# Altium footprint library PcbLib1.PcbLib: 30 footprints (part 2 of 2)
Each footprint in its own frame and in the unit in brackets; x right, y up, seen from the top. Pads: shape width x height; smd on the part's side, far side on the other; paste and mask are expansions set on the pad; w line width, h text height; cw(c..) or ccw(c..) is an arc to the next point about the centre after c.
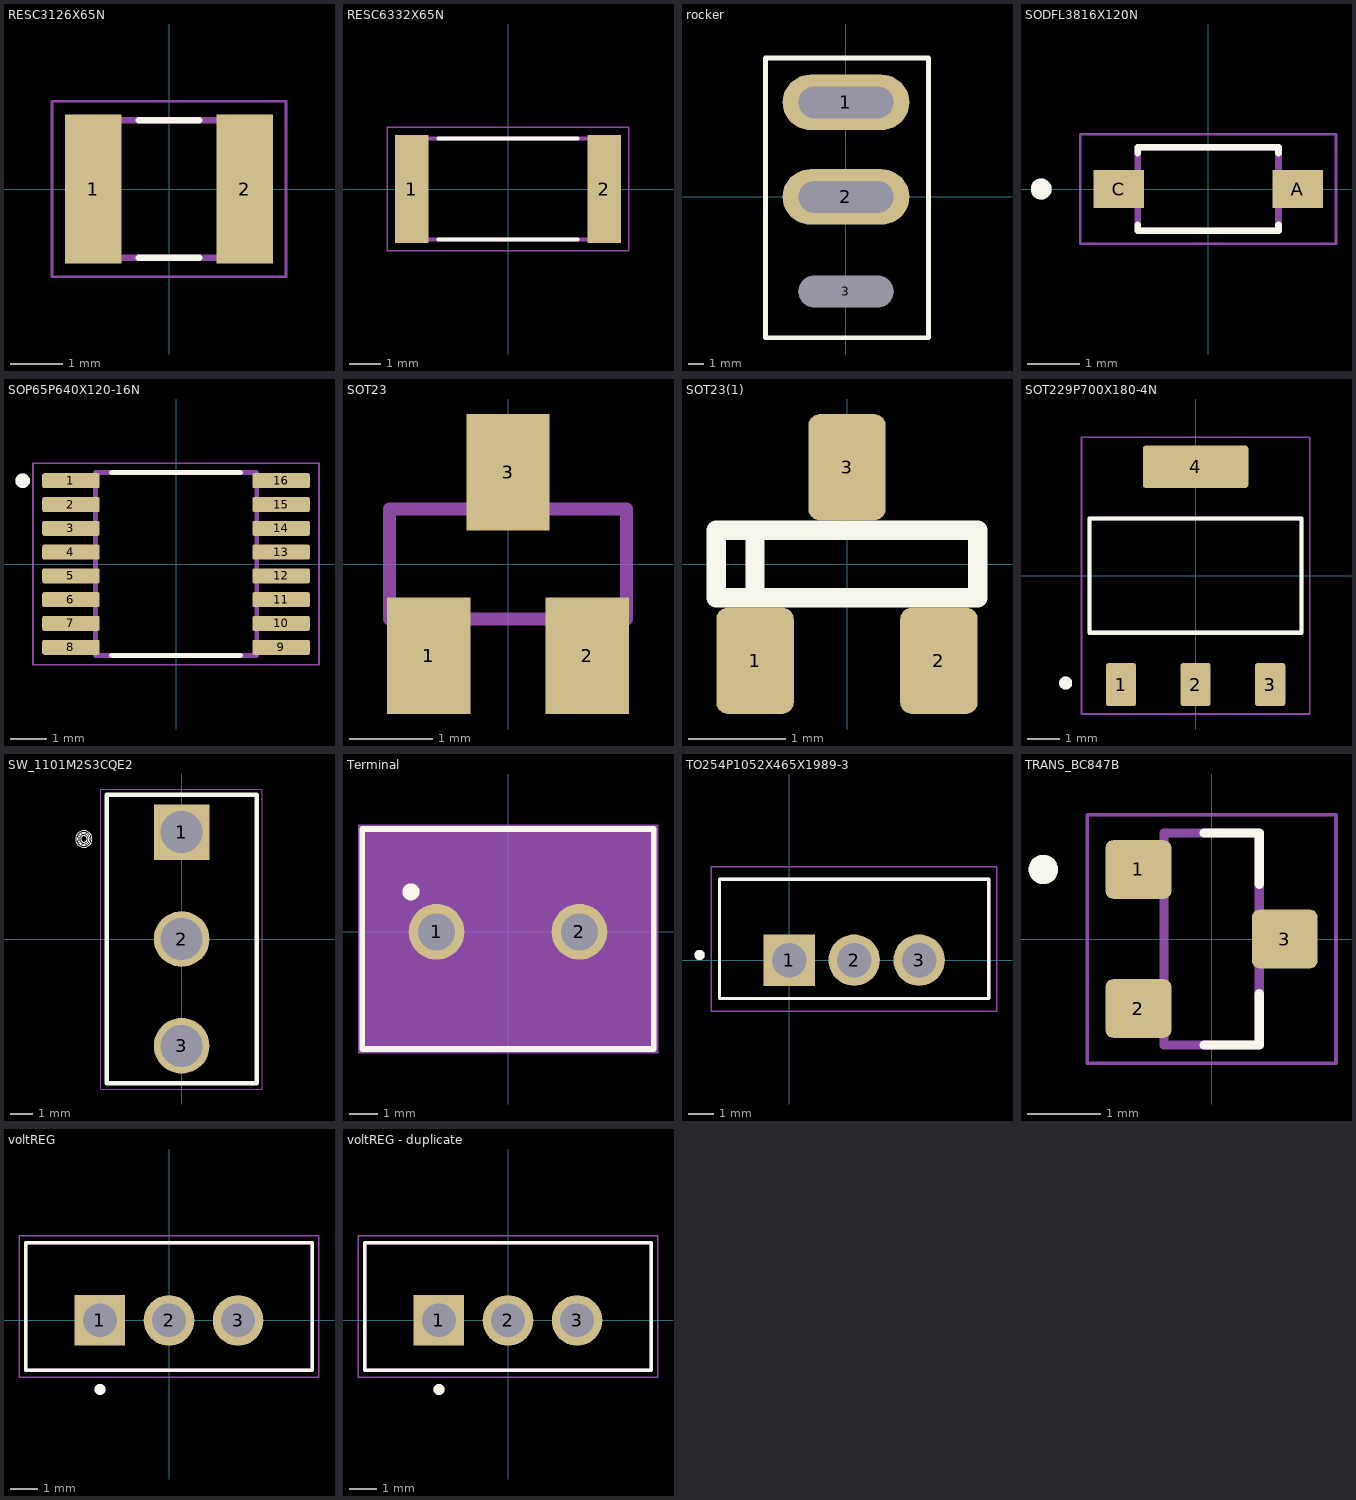
[diagram p1: the footprints below, top view; thin cyan lines are the x and y axes]

## RESC3126X65N [mm]
height 0.65
pads (2):
  rect 1.07x2.82 smd paste+0 mask+0.102: 1(-1.43,0) 2(1.43,0)
Top Overlay:
  lines w0.127: -0.575,-1.3 0.575,-1.3 ; -0.575,1.3 0.575,1.3
Mechanical 13:
  lines w0.127: -1.55,-1.3 -1.55,1.3 1.55,1.3 1.55,-1.3 -1.55,-1.3
Mechanical 15:
  lines w0.05: -2.215,-1.66 -2.215,1.66 2.215,1.66 2.215,-1.66 -2.215,-1.66
3D body "step_temp.STEP": height 0.65, standoff 0, extent -1.55,-1.3 1.55,1.3

## RESC6332X65N [mm]
height 0.65
pads (2):
  rect 1.07x3.42 smd paste+0 mask+0.102: 1(-3.055,0) 2(3.055,0)
Top Overlay:
  lines w0.127: -2.2,-1.6 2.2,-1.6 ; -2.2,1.6 2.2,1.6
Mechanical 13:
  lines w0.127: -3.175,-1.6 -3.175,1.6 3.175,1.6 3.175,-1.6 -3.175,-1.6
Mechanical 15:
  lines w0.05: -3.84,-1.96 -3.84,1.96 3.84,1.96 3.84,-1.96 -3.84,-1.96
3D body "step_temp.STEP": height 0.65, standoff 0, extent -3.175,-1.6 3.175,1.6

## rocker [mm]
pads (3):
  oval 8x3.5 hole 2 slot 6 at 0 deg: 1(0,5.969) 2(0,0)
  oval 5x1 hole 2 slot 6 at 0 deg: 3(0,-5.969)
Top Overlay:
  lines w0.3: -5.08,-8.89 -5.08,8.763 5.207,8.763 5.207,-8.89 -5.08,-8.89
Top Designator:
  text ".Designator" at -3.999,-0.267 h0.8
3D body "RockerSwitch.STEP": height 16.8, standoff -8, extent -7.4,-10.5 7.4,10.5

## SODFL3816X120N [mm]
height 1.2
pads (2):
  rect 0.97x0.73 smd paste+0 mask+0.102: A(1.72,0) C(-1.72,0)
Top Overlay:
  circle w0.2: c-3.205,0 r0.1
  lines w0.127: -1.35,-0.685 -1.35,-0.8 1.35,-0.8 1.35,-0.685 ; -1.35,0.685 -1.35,0.8 1.35,0.8 1.35,0.685
Mechanical 13:
  circle w0.2: c-3.205,0 r0.1
  lines w0.127: -1.35,-0.8 1.35,-0.8 1.35,0.8 -1.35,0.8 -1.35,-0.8
Mechanical 15:
  lines w0.05: -2.455,-1.05 2.455,-1.05 2.455,1.05 -2.455,1.05 -2.455,-1.05
3D body "step_temp.STEP": height 1.1, standoff 0.1, extent -1.9,-0.8 1.9,0.8

## SOP65P640X120-16N [mm]
pads (16):
  rrect25% 1.57x0.41 smd: 1(-2.87,2.275) 2(-2.87,1.625) 3(-2.87,0.975) 4(-2.87,0.325) 5(-2.87,-0.325) 6(-2.87,-0.975) 7(-2.87,-1.625) 8(-2.87,-2.275) 9(2.87,-2.275) 10(2.87,-1.625) 11(2.87,-0.975) 12(2.87,-0.325) 13(2.87,0.325) 14(2.87,0.975) 15(2.87,1.625) 16(2.87,2.275)
Top Overlay:
  circle w0.2: c-4.19,2.275 r0.1
  lines w0.127: -1.765,-2.5 1.765,-2.5 ; -1.765,2.5 1.765,2.5
Mechanical 13:
  circle w0.2: c-4.19,2.275 r0.1
  lines w0.127: -2.2,-2.5 -2.2,2.5 2.2,2.5 2.2,-2.5 -2.2,-2.5
Mechanical 15:
  lines w0.05: -3.905,-2.75 -3.905,2.75 3.905,2.75 3.905,-2.75 -3.905,-2.75
3D body "step_temp.STEP": height 1.2, standoff 0, extent -3.2,-2.5 3.2,2.5

## SOT23 [mm]
pads (3):
  rect 1x1.4 smd paste+0 mask+0.102: 1(-0.95,-1.1) 2(0.95,-1.1) 3(0,1.1)
Mechanical 13:
  region: 0.229,0.711 -0.229,0.711 -0.229,1.295 0.229,1.295
  region: 1.168,-1.295 0.711,-1.295 0.711,-0.711 1.168,-0.711
  region: -0.711,-1.295 -1.168,-1.295 -1.168,-0.711 -0.711,-0.711
  lines w0.152: -1.422,-0.66 1.422,-0.66 1.422,0.66 -1.422,0.66 -1.422,-0.66
3D body "step_temp.STEP": height 1.25, standoff 0, extent -1.45,-1.527 1.45,1.273

## SOT23(1) [mm]
pads (3):
  rrect30% 0.8x1.1 smd: 1(-0.95,-1) 2(0.95,-1) 3(0,1)
Top Overlay:
  lines w0.2: -0.95,-0.35 -1.35,-0.35 -1.35,0.35 -0.95,0.35 ; -0.95,-0.35 1.35,-0.35 1.35,0.35 -0.95,0.35 ; -0.95,-0.35 -0.95,0.35
3D body "step_temp.STEP": height 1.25, standoff 0, extent -1.46,-1.312 1.46,1.058

## SOT229P700X180-4N [mm]
height 1.8
pads (4):
  rrect15% 0.93x1.31 smd: 1(-2.29,-3.345) 2(0,-3.345) 3(2.29,-3.345)
  rrect15% 3.24x1.31 smd: 4(0,3.345)
Top Overlay:
  circle w0.2: c-3.99,-3.3 r0.1
  lines w0.127: -3.253,-1.753 3.253,-1.753 3.253,1.753 -3.253,1.753 -3.253,-1.753
Mechanical 13:
  circle w0.2: c-3.99,-3.3 r0.1
  lines w0.127: -3.253,-1.753 3.253,-1.753 3.253,1.753 -3.253,1.753 -3.253,-1.753
Mechanical 15:
  lines w0.05: -3.502,-4.25 3.502,-4.25 3.502,4.25 -3.502,4.25 -3.502,-4.25
3D body "step_temp.STEP": height 1.8, standoff 0, extent -3.251,-3.499 3.251,3.499

## SW_1101M2S3CQE2 [mm]
pads (3):
  rect 2.45x2.45 / inner round 2.45 / far side rect 2.45x2.45 hole 1.85: 1(0,4.7)
  round 2.45 hole 1.85: 2(0,0) 3(0,-4.7)
Top Overlay:
  circle w0.05: c-4.3,4.4 r0.361
  circle w0.05: c-4.3,4.4 r0.283
  circle w0.05: c-4.3,4.4 r0.224
  circle w0.05: c-4.3,4.4 r0.141
  circle w0.05: c-4.3,4.4 r0.224
  circle w0.05: c-4.3,4.4 r0.224
  lines w0.2: -3.3,-6.35 3.3,-6.35 3.3,6.35 -3.3,6.35 -3.3,-6.35
Mechanical 15:
  lines w0.05: -3.55,-6.6 3.55,-6.6 3.55,6.6 -3.55,6.6 -3.55,-6.6
3D body "step_temp.STEP": height 13.33, standoff -4.44, extent -3.302,-6.35 3.302,6.35

## Terminal [mm]
pads (2):
  round 1.95 hole 1.3: 1(-2.5,0) 2(2.5,0)
Top Overlay:
  circle w0.4: c-3.4,1.4 r0.1
  lines w0.2: -5.1,-4.1 -5.1,3.6 5.1,3.6 5.1,-4.1 -5.1,-4.1
Mechanical 13:
  lines w0.1: -5,-4 -5,3.5 5,3.5 5,-4 -5,-4
Mechanical 15:
  region: 5.25,-4.25 -5.25,-4.25 -5.25,3.75 5.25,3.75
3D body "691137710002+%28rev1%29.stp": height 11.51, standoff -3.58, extent -4.873,-4.064 5.127,3.436

## TO254P1052X465X1989-3 [mm]
pads (3):
  rect 2.01x2.01 / inner round 2.01 / far side rect 2.01x2.01 hole 1.34: 1(0,0)
  round 2.01 hole 1.34: 2(2.54,0) 3(5.08,0)
Top Overlay:
  circle w0.2: c-3.5,0.2 r0.1
  lines w0.127: -2.72,-1.5 7.8,-1.5 7.8,3.16 -2.72,3.16 -2.72,-1.5
Mechanical 13:
  circle w0.2: c-3.5,0.2 r0.1
  lines w0.127: -2.72,-1.5 7.8,-1.5 7.8,3.16 -2.72,3.16 -2.72,-1.5
Mechanical 15:
  lines w0.05: -3.04,-2.005 8.12,-2.005 8.12,3.655 -3.04,3.655 -3.04,-2.005
3D body "step_temp.STEP": height 20.9, standoff -9.35, extent -2.578,-1.651 7.658,2.794

## TRANS_BC847B [mm]
pads (3):
  rrect25% 0.9x0.8 smd paste+0 mask+0.102: 1(-1,0.95) 2(-1,-0.95) 3(1,0)
Top Overlay:
  circle w0.2: c-2.3,0.95 r0.1
  lines w0.127: -0.1,-1.45 0.65,-1.45 0.65,-0.75 ; -0.1,1.45 0.65,1.45 0.65,0.75
Mechanical 13:
  circle w0.2: c-2.3,0.95 r0.1
  lines w0.127: -0.65,-1.45 -0.65,1.45 0.65,1.45 0.65,-1.45 -0.65,-1.45
Mechanical 15:
  lines w0.05: -1.7,-1.7 -1.7,1.7 1.7,1.7 1.7,-1.7 -1.7,-1.7
3D body "step_temp.STEP": height 1.3, standoff 0, extent -1.3,-1.52 1.3,1.52

## voltREG [mm]
pads (3):
  rect 1.86x1.86 / inner round 1.86 / far side rect 1.86x1.86 hole 1.24: 1(-2.54,0)
  round 1.86 hole 1.24: 2(0,0) 3(2.54,0)
Top Overlay:
  circle w0.2: c-2.54,-2.54 r0.1
  lines w0.127: -5.27,-1.84 5.27,-1.84 5.27,2.86 -5.27,2.86 -5.27,-1.84
Mechanical 13:
  circle w0.2: c-2.54,-2.54 r0.1
  lines w0.127: -5.27,-1.84 5.27,-1.84 5.27,2.86 -5.27,2.86 -5.27,-1.84
Mechanical 15:
  lines w0.05: -5.52,-2.09 5.52,-2.09 5.52,3.11 -5.52,3.11 -5.52,-2.09
3D body "LM7805CT_NOPB.STEP": height 15.59, standoff -13.95, extent -5.08,-2.512 5.08,3.683

## voltREG - duplicate [mm]
pads (3):
  rect 1.86x1.86 / inner round 1.86 / far side rect 1.86x1.86 hole 1.24: 1(-2.54,0)
  round 1.86 hole 1.24: 2(0,0) 3(2.54,0)
Top Overlay:
  circle w0.2: c-2.54,-2.54 r0.1
  lines w0.127: -5.27,-1.84 5.27,-1.84 5.27,2.86 -5.27,2.86 -5.27,-1.84
Mechanical 13:
  circle w0.2: c-2.54,-2.54 r0.1
  lines w0.127: -5.27,-1.84 5.27,-1.84 5.27,2.86 -5.27,2.86 -5.27,-1.84
Mechanical 15:
  lines w0.05: -5.52,-2.09 5.52,-2.09 5.52,3.11 -5.52,3.11 -5.52,-2.09
3D body "LM7805CT_NOPB.STEP": height 15.59, standoff -13.95, extent -5.08,-2.512 5.08,3.683